# Altium footprint library 逸芬的库鸭.PcbLib: 255 footprints (part 19 of 20)
Each footprint in its own frame and in the unit in brackets; x right, y up, seen from the top. Pads: shape width x height; smd on the part's side, far side on the other; paste and mask are expansions set on the pad; w line width, h text height; cw(c..) or ccw(c..) is an arc to the next point about the centre after c.
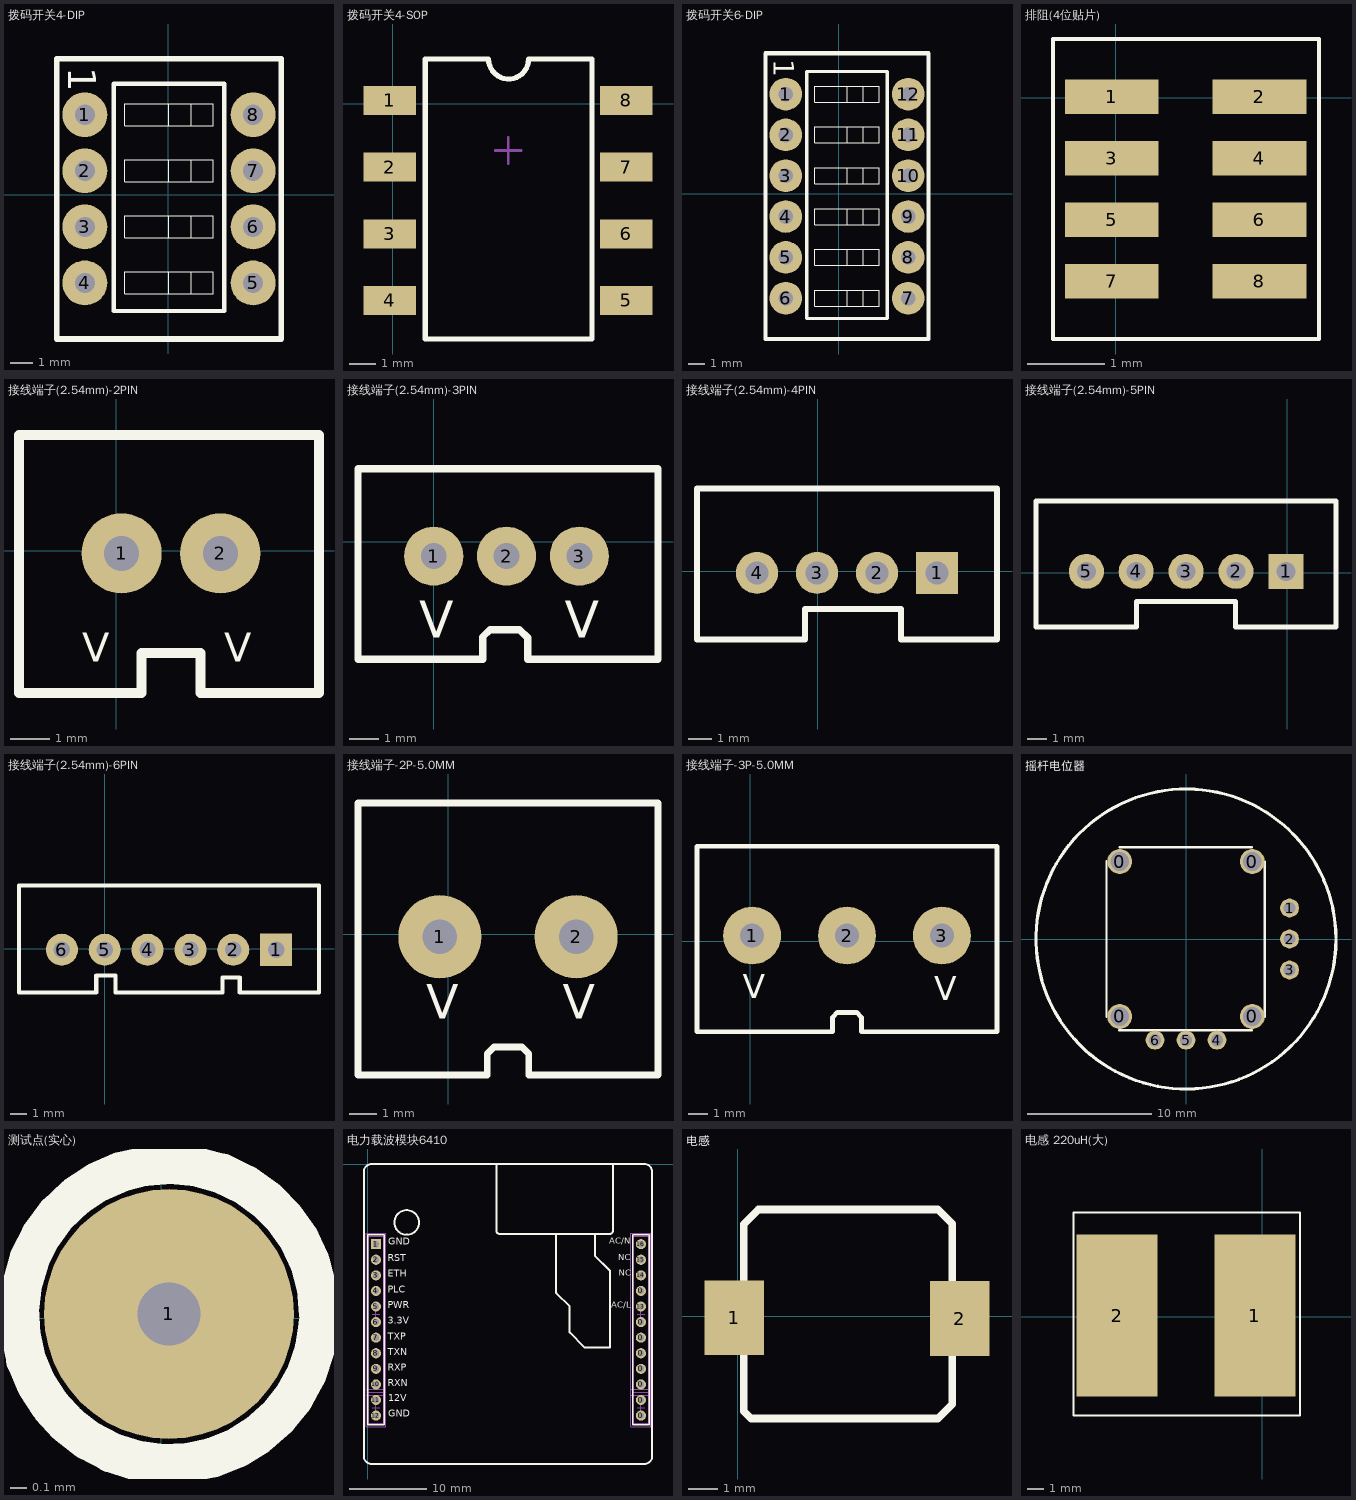
[diagram p18: the footprints below, top view; thin cyan lines are the x and y axes]

## 拨码开关4-DIP [mil]
pads (8):
  round 80 hole 36: 1(-148.7,142.5) 2(-148.7,42.5) 3(-148.7,-57.5) 4(-148.7,-157.5) 5(151.3,-157.5) 6(151.3,-57.5) 7(151.3,42.5) 8(151.3,142.5)
Top Overlay:
  lines w0.98: 1.3,-177.19 1.3,-137.82 ; 1.3,-77.19 1.3,-37.82 ; 1.3,22.81 1.3,62.18 ; 1.3,122.81 1.3,162.18 ; 40.67,-177.19 40.67,-137.82 ; 40.67,-77.19 40.67,-37.82 ; 40.67,22.81 40.67,62.18 ; 40.67,122.81 40.67,162.18 ; -77.44,-177.19 -77.44,-137.82 80.04,-137.82 80.04,-177.19 -77.44,-177.19 ; -77.44,-77.19 -77.44,-37.82 80.04,-37.82 80.04,-77.19 -77.44,-77.19 ; -77.44,22.81 -77.44,62.18 80.04,62.18 80.04,22.81 -77.44,22.81 ; -77.44,122.81 -77.44,162.18 80.04,162.18 80.04,122.81 -77.44,122.81
  lines w7.87: -97.13,-207.5 -97.13,197.62 99.73,197.62 99.73,-207.5 -97.13,-207.5
  lines w10: -198.7,-257.5 201.3,-257.5 201.3,242.5 -198.7,242.5 -198.7,-257.5
  text "1" at -178.7,227.5 h50
3D body "User Library-2_54X4.STEP": height 275.59, standoff -151.57, extent -203,-234 186.76,223.48

## 拨码开关4-SOP [mm]
pads (8):
  rect 2x1.1 smd: 1(-0.103,0.121) 2(-0.103,-2.419) 3(-0.103,-4.959) 4(-0.103,-7.499) 5(8.897,-7.499) 6(8.897,-4.959) 7(8.897,-2.419) 8(8.897,0.121)
Top Overlay:
  lines w0.2: 1.245,-8.966 1.245,1.702 3.658,1.702 ccw(c4.42,1.702) 5.182,1.702 7.595,1.702 7.595,-8.966 1.245,-8.966
Mechanical 15:
  lines w0.1: 3.907,-1.784 4.907,-1.784 ; 4.407,-2.284 4.407,-1.284
3D body: height 2.15, standoff 2.05, extent 5.309,-8.204 6.833,-6.68
3D body: height 2.15, standoff 2.05, extent 5.309,-5.664 6.833,-4.14
3D body: height 2.15, standoff 2.05, extent 2.388,-3.124 3.912,-1.6
3D body: height 2.15, standoff 2.05, extent 5.309,-0.584 6.833,0.94
3D body: height 2.05, standoff 2, extent 2.388,-8.204 6.833,-6.68
3D body: height 2.05, standoff 2, extent 2.388,-5.664 6.833,-4.14
3D body: height 2.05, standoff 2, extent 2.388,-3.124 6.833,-1.6
3D body: height 2.05, standoff 2, extent 2.388,-0.584 6.833,0.94
3D body: height 2, standoff 0, extent 0.991,-8.712 7.849,1.575

## 拨码开关6-DIP [mil]
pads (12):
  round 80 hole 36: 1(-130.2,243.9) 2(-130.2,143.9) 3(-130.2,43.9) 4(-130.2,-56.1) 5(-130.2,-156.1) 6(-130.2,-256.1) 7(169.8,-256.1) 8(169.8,-156.1) 9(169.8,-56.1) 10(169.8,43.9) 11(169.8,143.9) 12(169.8,243.9)
Top Overlay:
  lines w0.98: 19.8,-275.79 19.8,-236.42 ; 19.8,-175.79 19.8,-136.42 ; 19.8,-75.79 19.8,-36.42 ; 19.8,24.21 19.8,63.58 ; 19.8,124.21 19.8,163.58 ; 19.8,224.21 19.8,263.58 ; 59.17,-275.79 59.17,-236.42 ; 59.17,-175.79 59.17,-136.42 ; 59.17,-75.79 59.17,-36.42 ; 59.17,24.21 59.17,63.58 ; 59.17,124.21 59.17,163.58 ; 59.17,224.21 59.17,263.58 ; -58.94,-275.79 98.54,-275.79 98.54,-236.42 -58.94,-236.42 -58.94,-275.79 ; -58.94,-175.79 98.54,-175.79 98.54,-136.42 -58.94,-136.42 -58.94,-175.79 ; -58.94,-75.79 98.54,-75.79 98.54,-36.42 -58.94,-36.42 -58.94,-75.79 ; -58.94,24.21 98.54,24.21 98.54,63.58 -58.94,63.58 -58.94,24.21 ; -58.94,124.21 98.54,124.21 98.54,163.58 -58.94,163.58 -58.94,124.21 ; -58.94,224.21 98.54,224.21 98.54,263.58 -58.94,263.58 -58.94,224.21
  lines w7.87: -78.63,-306.1 118.23,-306.1 118.23,299.02 -78.63,299.02 -78.63,-306.1
  lines w10: -180.2,-356.1 219.8,-356.1 219.8,343.9 -180.2,343.9 -180.2,-356.1
  text "1" at -160.2,328.9 h50
3D body: height 275.59, standoff -145.67, extent -177.2,-322.79 212.57,316.59

## 排阻(4位贴片) [mm]
pads (8):
  rect 1.22x0.45 smd: 1(-0.051,0.013) 2(1.869,0.013) 3(-0.051,-0.787) 4(1.869,-0.787) 5(-0.051,-1.587) 6(1.869,-1.587) 7(-0.051,-2.387) 8(1.869,-2.387)
Top Overlay:
  lines w0.05: -0.813,-3.137 -0.813,0.763 2.642,0.763 2.642,-3.137 -0.813,-3.137
3D body "R1206-4R.step": height 0.59, standoff 0.01, extent 0.102,-2.794 1.702,0.406

## 接线端子(2.54mm)-2PIN [mil]
pads (2):
  round 80 hole 35: 1(5.42,-2.44) 2(103.84,-2.44)
Top Overlay:
  lines w10: 141.42,-141.76 202.27,-141.76 202.27,115.67 -96.94,115.67 -96.94,-141.76 25.1,-141.76 25.1,-101.76 84.16,-101.76 84.16,-141.76 151.42,-141.76
  text "V" at -33.95,-120.55 h50
  text "V" at 107.78,-120.55 h50
3D body: height 459.84, standoff -140.16, extent -48.52,-139.05 151.48,110.95

## 接线端子(2.54mm)-3PIN [mil]
pads (3):
  round 80 hole 35: 1(0,-19.68) 2(98.43,-19.68) 3(196.85,-19.68)
Top Overlay:
  lines w10: 136,-159 303.15,-159 303.15,98.43 -102.36,98.43 -102.36,-159 66,-159 66,-129 76,-119 116,-119 127,-130 127,-159 146,-159
  text "V" at 177.17,-129.92 h50
  text "V" at -19.68,-129.92 h50
3D body: height 459.84, standoff -140.16, extent -51.57,-157.48 248.43,92.52

## 接线端子(2.54mm)-4PIN [mil]
pads (4):
  rect 70x70 hole 38: 1(199.11,-3)
  round 70 hole 38: 2(99.11,-3) 3(-0.89,-3) 4(-100.89,-3)
Top Overlay:
  lines w10: -200.89,-114.17 -200.89,137.8 299.11,137.8 299.11,-114.17 139.11,-114.17 139.11,-63 -0.89,-63 -20.89,-63 -20.89,-114.17 -200.89,-114.17
3D body: height 459.84, standoff -140.16, extent -148.82,-118.11 251.18,131.89

## 接线端子(2.54mm)-5PIN [mil]
pads (5):
  rect 70x70 hole 38: 1(-2.66,2.91)
  round 70 hole 38: 2(-102.66,2.91) 3(-202.66,2.91) 4(-302.66,2.91) 5(-402.07,2.91)
Top Overlay:
  lines w10: -502.95,-108.27 -502.95,143.7 97.34,143.7 97.34,-108.27 -103.35,-108.27 -103.35,-57.09 -202.66,-57.09 -302.17,-57.09 -302.17,-108.27 -502.95,-108.27
3D body: height 236.22, standoff -98.43, extent -493.11,-78.74 97.44,70.87

## 接线端子(2.54mm)-6PIN [mil]
pads (6):
  rect 75x75 hole 38: 1(399.35,-2.1)
  round 75 hole 38: 2(299.35,-2.1) 3(199.35,-2.1) 4(99.35,-2.1) 5(-0.65,-2.1) 6(-100.65,-2.1)
Top Overlay:
  lines w10: -200.65,-102.1 -20.65,-102.1 -20.65,-62.1 14.35,-62.1 24.35,-62.1 24.35,-102.1 274.35,-102.1 274.35,-67.1 314.35,-67.1 314.35,-102.1 499.35,-102.1 499.35,147.9 -200.65,147.9 -200.65,-102.1
3D body: height 236.22, standoff -78.74, extent -125.98,-74.8 425.2,102.36

## 接线端子-2P-5.0MM [mil]
pads (2):
  round 120 hole 50: 1(-11.81,-3.94) 2(185.04,-3.94)
Top Overlay:
  lines w10: -129.92,-203.31 56.61,-203.31 56.61,-173.31 66.61,-163.31 106.61,-163.31 116.61,-173.31 116.61,-203.31 136.61,-203.31 ; -129.92,-200.79 -129.92,188.98 303.15,188.98 303.15,-200.79 ; 126.61,-203.31 303.15,-203.31
  text "V" at 165.35,-122.05 h50
  text "V" at -31.5,-122.05 h50
3D body: height 433.07, standoff -78.74, extent -106.3,-153.54 287.4,161.42

## 接线端子-3P-5.0MM [mil]
pads (3):
  round 120 hole 50: 1(3.94,11.81) 2(200.79,11.81) 3(397.64,11.81)
Top Overlay:
  lines w10: -110.24,-187.56 170.79,-187.56 170.79,-157.56 180.79,-147.56 220.79,-147.56 230.79,-157.56 230.79,-187.56 511.81,-187.56 511.81,196.85 -110.24,196.85 -110.24,-187.56
  text "V" at -15.75,-118.11 h50
  text "V" at 381.89,-122.05 h50
3D body: height 433.07, standoff -78.74, extent -94.49,-153.54 496.06,161.42

## 摇杆电位器 [mm] "摇杆电位器"
pads (10):
  round 2 hole 1.5: 0(-5.35,-6.25) 0(-5.35,6.25) 0(5.35,-6.25) 0(5.35,6.25)
  round 1.524 hole 1: 1(8.35,2.5) 2(8.35,0) 3(8.35,-2.5) 4(2.5,-8.15) 5(0,-8.15) 6(-2.5,-8.15)
Top Overlay:
  lines w0.178: -6.401,-6.299 -6.401,6.299 ; -5.385,-7.366 5.309,-7.366 ; -5.359,7.391 5.334,7.391 ; 6.35,-6.274 6.35,6.248
  lines w0.254: 12.097,-0.051 cw(c0,0) 12.097,0.076
3D body "User Library-XBOX360.STEP": height 29, standoff -2, extent -14.34,-12.57 13.56,13.23

## 测试点(实心) [mm]
pads (1):
  round 1.5 hole 0.381: 1(0.048,0.025)
Top Overlay:
  lines w0.24: 0.946,-0.035 cw(c0.048,0.025) 0.948,0.025

## 电力载波模块6410 [mm]
pads (24):
  round 1.3 hole 0.8: 0(35.059,-32.289) 0(35.059,-30.289) 0(35.059,-28.289) 0(35.059,-26.289) 0(35.059,-24.289) 0(35.059,-22.289) 0(35.059,-20.289) 0(35.059,-16.289) 2(1.059,-12.289) 3(1.059,-14.289) 4(1.059,-16.289) 5(1.059,-18.289) 6(1.059,-20.289) 7(1.059,-22.289) 8(1.059,-24.289) 9(1.059,-26.289) 10(1.059,-28.289) 11(1.059,-30.289) 12(1.059,-32.289) 13(35.059,-18.289) 14(35.059,-14.289) 15(35.059,-12.289) 16(35.059,-10.289)
  rect 1.3x1.3 hole 0.8: 1(1.059,-10.289)
Top Overlay:
  circle w0.254: c5,-7.5 r1.581
  lines w0.2: -0.016,-29.489 -0.016,-9.089 2.134,-9.089 2.134,-29.489 ; -0.016,-29.089 -0.016,-33.489 2.134,-33.489 2.134,-29.089 ; 33.984,-29.489 33.984,-9.089 36.134,-9.089 36.134,-29.489 ; 33.984,-29.089 33.984,-33.489 36.134,-33.489 36.134,-29.089
  lines w0.254: 16.5,0 16.5,-8.5 ccw(c17,-8.5) 17,-9 31,-9 ccw(c31,-8.5) 31.5,-8.5 31.5,0 ; 24.181,-9.068 24.181,-16.561 24.206,-16.561 25.908,-18.263 25.908,-19.279 25.908,-21.59 ; 25.933,-21.615 25.908,-21.59 ; 29.159,-9.144 29.159,-11.76 31.064,-13.665 31.064,-23.52 27.813,-23.52 25.908,-21.615 25.908,-21.59 ; -0.5,-37.5 ccw(c0.5,-37.5) 0.5,-38.5 35.5,-38.5 ccw(c35.5,-37.5) 36.5,-37.5 36.5,-1 ccw(c35.5,-1) 35.5,0 0.5,0 ccw(c0.5,-1) -0.5,-1 -0.5,-37.5
  text "NC" at 32.182,-14.63 h1.4
  text "NC" at 32.156,-12.675 h1.4
  text "AC/L" at 31.242,-18.745 h1.4
  text "AC/N" at 30.963,-10.541 h1.4
  text "GND" at 2.642,-32.766 h1.52
  text "12V" at 2.64,-30.773 h1.52
  text "RXN" at 2.54,-28.867 h1.52
  text "RXP" at 2.54,-26.86 h1.52
  text "TXN" at 2.542,-24.854 h1.52
  text "TXP" at 2.542,-22.847 h1.52
  text "3.3V" at 2.54,-20.826 h1.52
  text "PWR" at 2.54,-18.834 h1.52
  text "PLC" at 2.54,-16.813 h1.52
  text "ETH" at 2.54,-14.821 h1.52
  text "RST" at 2.54,-12.8 h1.52
  text "GND" at 2.642,-10.693 h1.52
Mechanical 13:
  lines w0.1: 0.059,-29.289 2.059,-29.289 ; 0.059,-29.289 0.059,-33.289 2.059,-33.289 2.059,-29.289 ; 0.059,-29.289 0.059,-9.289 2.059,-9.289 2.059,-29.289 ; 0.059,-29.289 2.059,-29.289 ; 34.059,-29.289 36.059,-29.289 ; 34.059,-29.289 34.059,-9.289 36.059,-9.289 36.059,-29.289 ; 34.059,-29.289 34.059,-33.289 36.059,-33.289 36.059,-29.289 ; 34.059,-29.289 36.059,-29.289
Mechanical 15:
  lines w0.05: 0.559,-31.289 1.559,-31.289 ; 0.559,-19.289 1.559,-19.289 ; 1.059,-31.789 1.059,-30.789 ; 1.059,-19.789 1.059,-18.789 ; 34.559,-31.289 35.559,-31.289 ; 34.559,-19.289 35.559,-19.289 ; 35.059,-31.789 35.059,-30.789 ; 35.059,-19.789 35.059,-18.789 ; -0.216,-33.689 -0.216,-28.889 2.334,-28.889 2.334,-33.689 -0.216,-33.689 ; -0.216,-29.689 -0.216,-8.889 2.334,-8.889 2.334,-29.689 -0.216,-29.689 ; 33.784,-33.689 36.334,-33.689 36.334,-28.889 33.784,-28.889 33.784,-33.689 ; 33.784,-29.689 36.334,-29.689 36.334,-8.889 33.784,-8.889 33.784,-29.689
3D body "62001011821.stp": height 4.35, standoff -2.65, extent 33.897,-29.42 36.397,-8.92
3D body "62000211821.stp": height 4.35, standoff -2.65, extent 33.887,-33.466 36.387,-28.966
3D body "62000211821.stp": height 4.35, standoff -2.65, extent -0.149,-33.416 2.351,-28.916
3D body "62001011821.stp": height 4.35, standoff -2.65, extent -0.139,-29.369 2.361,-8.869

## 电感 [mm]
pads (2):
  rect 2x2.5 smd: 1(-0.12,-0.044) 2(7.423,-0.069)
Top Overlay:
  lines w0.254: 0.19,-3.167 0.44,-3.417 6.69,-3.417 7.175,-2.932 7.175,3.098 6.69,3.583 0.69,3.583 0.19,3.083 0.19,-3.167
3D body "User Library-Inductor VLC6045 Series.STEP": height 4.5, standoff 0, extent 0.636,-2.981 6.636,3.019

## 电感 220uH(大) [mm]
pads (2):
  rect 5x10 smd: 1(-0.444,0.06) 2(-8.944,0.06)
Top Overlay:
  lines w0.127: -11.62,-6.09 -11.62,6.41 2.325,6.41 2.325,-6.09 -11.62,-6.09
3D body: height 4, standoff 0, extent -8.597,-3.279 -1.485,3.833